# Altium footprint library Misc.PcbLib: 159 footprints (part 5 of 10)
Each footprint in its own frame and in the unit in brackets; x right, y up, seen from the top. Pads: shape width x height; smd on the part's side, far side on the other; paste and mask are expansions set on the pad; w line width, h text height; cw(c..) or ccw(c..) is an arc to the next point about the centre after c.
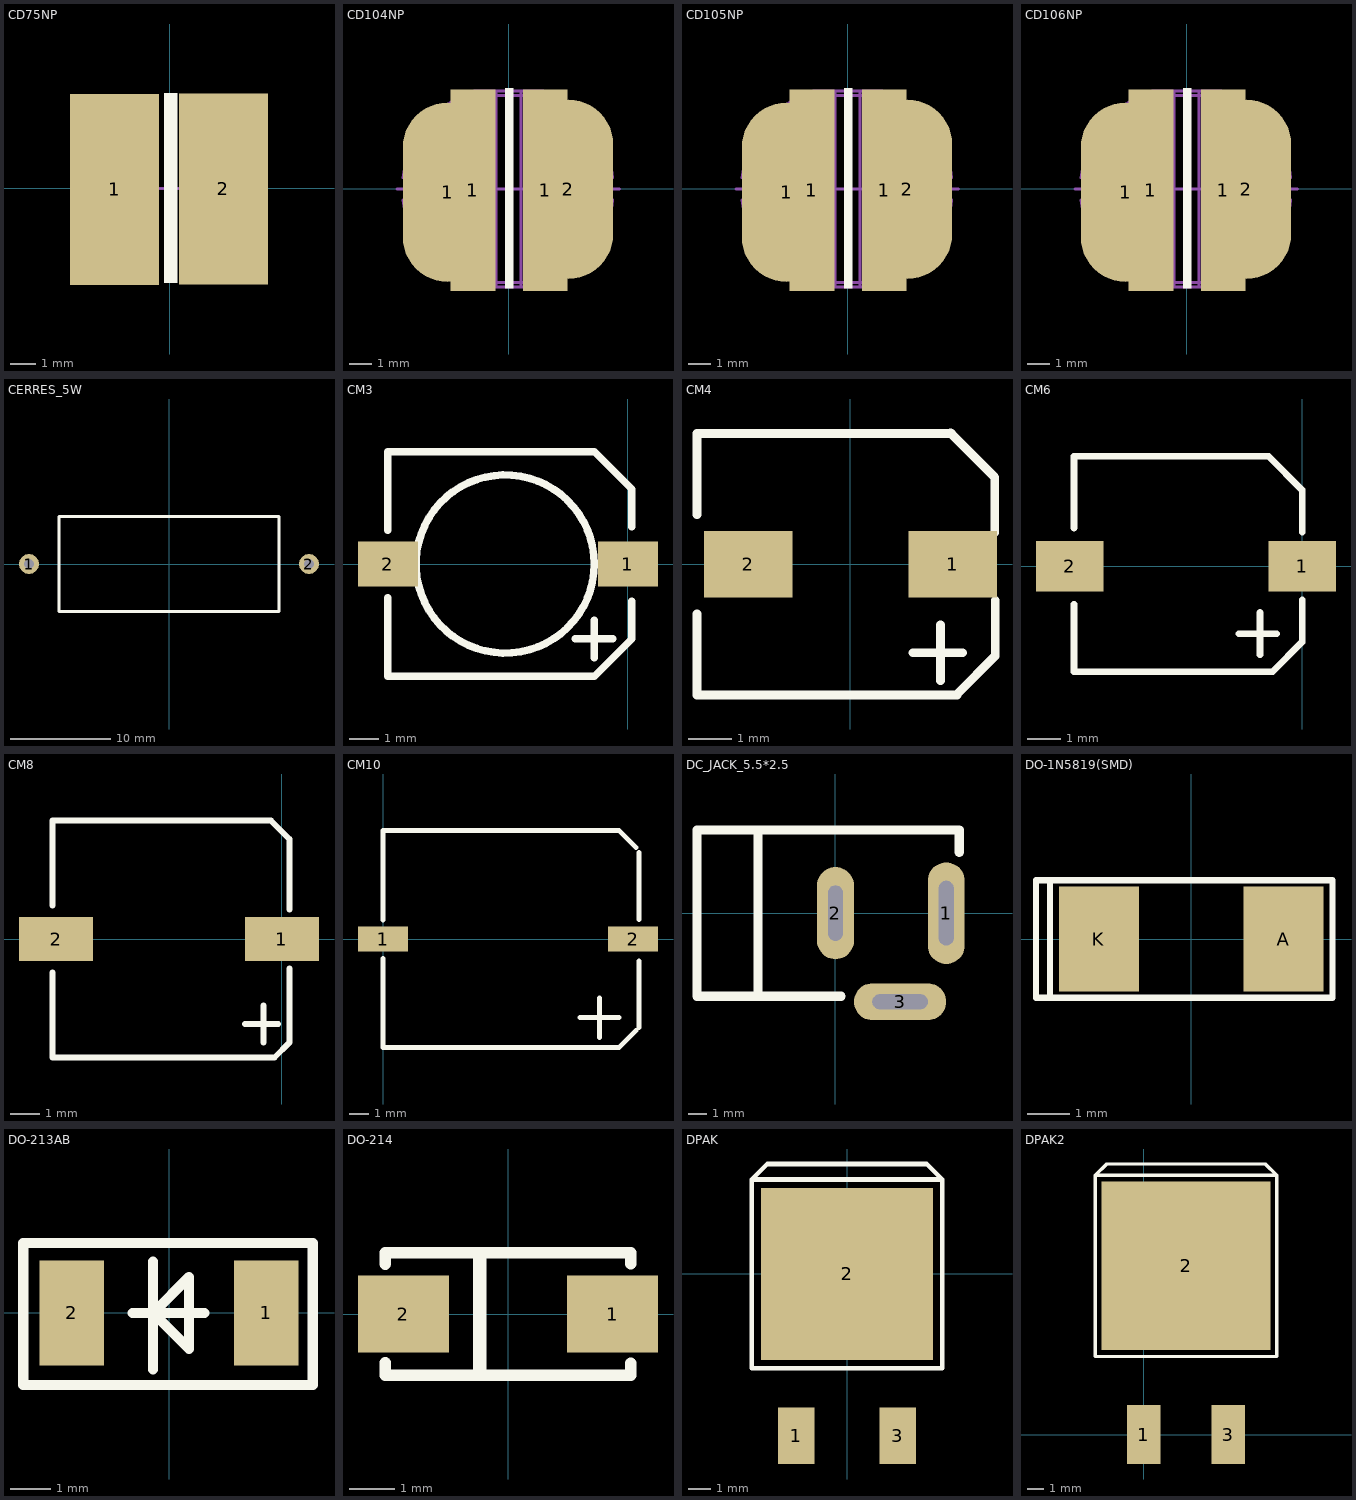
[diagram p4: the footprints below, top view; thin cyan lines are the x and y axes]

## CD75NP [mm]
pads (2):
  rect 3.5x7.5 smd: 1(-2.174,-0.051) 2(2.101,-0.028)
Top Overlay:
  rectangle: -0.232,-3.717 0.292,3.732
Mechanical 2:
  lines w0.127: -1.831,-0.017 1.584,-0.017 ; -0.016,-1.741 -0.016,1.427 ; -3.32,-0.82 ccw(c-0.016,-0.017) -1.616,-3.017 -0.766,-3.017 -0.766,2.983 -1.616,2.983 ccw(c-0.016,-0.017) -3.32,0.786 cw(c-3.916,-0.017) -3.32,-0.82 ; 0.734,-3.017 1.584,-3.017 ccw(c-0.016,-0.017) 3.288,-0.82 cw(c3.884,-0.017) 3.288,0.786 ccw(c-0.016,-0.017) 1.584,2.983 0.734,2.983 0.734,-3.017
3D body "CD75.STEP": height 5, standoff -0.05, extent -3.911,-3.567 3.825,3.433

## CD104NP [mm]
pads (4):
  oval 4x8 smd: 1(-2.741,-0.165) 2(2.652,-0.031)
  rect 2x9 smd: 1(-1.613,-0.082) 1(1.615,-0.082)
Top Overlay:
  rectangle: -0.189,-4.455 0.196,4.487
Mechanical 2:
  lines w0.127: -5.002,-0.017 4.931,-0.017 ; -0.016,-4.17 -0.016,4.264 ; -4.733,-0.515 ccw(c-0.017,0.102) -1.558,-4.398 1.523,-4.398 ccw(c-0.035,0.037) 4.633,-0.515 cw(c4.665,-0.016) 4.632,0.483 ccw(c-0.035,-0.079) 1.524,4.355 -1.558,4.355 ccw(c-0.018,-0.145) -4.732,0.483 cw(c-4.766,-0.016) -4.733,-0.515 ; -4.508,-0.667 ccw(c-4.766,-0.016) -4.507,0.634 cw(c-0.018,-0.145) -1.524,4.155 1.489,4.155 cw(c-0.035,-0.079) 4.408,0.635 ccw(c4.665,-0.016) 4.41,-0.668 cw(c-0.035,0.037) 1.489,-4.198 -1.524,-4.198 cw(c-0.017,0.102) -4.508,-0.667 ; -0.569,-4.398 0.538,-4.398 0.538,4.355 -0.569,4.355 -0.569,-4.398
3D body "CD104.STEP": height 4, standoff -0.05, extent -4.671,-4.396 4.695,4.356

## CD105NP [mm]
pads (4):
  oval 4x8 smd: 1(-2.741,-0.165) 2(2.652,-0.031)
  rect 2x9 smd: 1(-1.613,-0.082) 1(1.615,-0.082)
Top Overlay:
  rectangle: -0.189,-4.455 0.196,4.487
Mechanical 2:
  lines w0.127: -5.002,-0.017 4.931,-0.017 ; -0.016,-4.17 -0.016,4.264 ; -4.733,-0.515 ccw(c-4.766,-0.016) -4.732,0.483 cw(c-0.018,-0.145) -1.558,4.355 1.524,4.355 cw(c-0.035,-0.079) 4.632,0.483 ccw(c4.665,-0.016) 4.633,-0.515 cw(c-0.035,0.037) 1.523,-4.398 -1.558,-4.398 cw(c-0.017,0.102) -4.733,-0.515 ; -4.508,-0.667 ccw(c-0.017,0.102) -1.524,-4.198 1.489,-4.198 ccw(c-0.035,0.037) 4.41,-0.668 cw(c4.665,-0.016) 4.408,0.635 ccw(c-0.035,-0.079) 1.489,4.155 -1.524,4.155 ccw(c-0.018,-0.145) -4.507,0.634 cw(c-4.766,-0.016) -4.508,-0.667 ; -0.569,-4.398 -0.569,4.355 0.538,4.355 0.538,-4.398 -0.569,-4.398
3D body "CD105.STEP": height 5.4, standoff -0.05, extent -4.671,-4.396 4.695,4.356

## CD106NP [mm]
pads (4):
  oval 4x8 smd: 1(-2.741,-0.165) 2(2.652,-0.031)
  rect 2x9 smd: 1(-1.613,-0.082) 1(1.615,-0.082)
Top Overlay:
  rectangle: -0.189,-4.455 0.196,4.487
Mechanical 2:
  lines w0.127: -5.002,-0.017 4.931,-0.017 ; -0.016,-4.17 -0.016,4.264 ; -4.733,-0.515 ccw(c-0.017,0.102) -1.558,-4.398 1.523,-4.398 ccw(c-0.035,0.037) 4.633,-0.515 cw(c4.665,-0.016) 4.632,0.483 ccw(c-0.035,-0.079) 1.524,4.355 -1.558,4.355 ccw(c-0.018,-0.145) -4.732,0.483 cw(c-4.766,-0.016) -4.733,-0.515 ; -4.508,-0.667 ccw(c-4.766,-0.016) -4.507,0.634 cw(c-0.018,-0.145) -1.524,4.155 1.489,4.155 cw(c-0.035,-0.079) 4.408,0.635 ccw(c4.665,-0.016) 4.41,-0.668 cw(c-0.035,0.037) 1.489,-4.198 -1.524,-4.198 cw(c-0.017,0.102) -4.508,-0.667 ; -0.569,-4.398 0.538,-4.398 0.538,4.355 -0.569,4.355 -0.569,-4.398
3D body "CD106.STEP": height 6.5, standoff -0.05, extent -4.671,-4.396 4.695,4.356

## CERRES_5W [mm]
height 9.5
pads (2):
  round 2 hole 1: 1(-14,0) 2(14,0)
Top Overlay:
  lines w0.254: -11,-4.75 11,-4.75 11,4.75 -11,4.75 -11,-4.75
3D body "RES-5W-High.STEP": height 8.01, standoff -9, extent -14.27,-3 14.47,3

## CM3 [mil]
pads (2):
  rect 80x60 smd: 1(0,0) 2(-320,0)
Top Overlay:
  circle w10: c-163.85,0 r118.85
  lines w10: -320,-45 -320,-150 -45,-150 5,-100 5,-50 ; -320,45 -320,150 -45,150 5,100 5,50 ; -70,-100 -20,-100 ; -45,-125 -45,-75
3D body "SL-E.step": height 204.72, standoff 0, extent -302.8,-119.84 -27.2,140

## CM4 [mil]
pads (2):
  rect 80x60 smd: 1(92.52,0) 2(-92.52,0)
Top Overlay:
  lines w8: -138.7,-45 -138.7,-118.11 96.3,-118.11 ; -138.7,45 -138.7,118.11 91.3,118.11 ; 56.3,-80 101.3,-80 ; 81.3,-105 81.3,-55 ; 90.55,118.54 130.55,78.54 130.55,28.54 ; 95.94,-117.83 130.94,-82.83 130.94,-32.84
3D body "SL-B.step": height 204.72, standoff 0, extent -96.1,-74.29 85,95

## CM6 [mil]
pads (2):
  rect 80x60 smd: 1(0,0) 2(-275,0)
Top Overlay:
  lines w8: -270,-45 -270,-125 -35,-125 0,-90 0,-40 ; -270,45 -270,130 -40,130 0,90 0,40 ; -75,-80 -30,-80 ; -50,-105 -50,-55
3D body "SL-D.step": height 204.72, standoff 0, extent -255.24,-93.66 -34.76,115

## CM8 [mil]
pads (2):
  rect 100x60 smd: 1(0,0) 2(-305,0)
Top Overlay:
  lines w8: -310,-45 -310,-160 -10,-160 10,-140 10,-40 ; -310,45 -310,160 -15,160 10,135 10,40 ; -50,-115 -5,-115 ; -25,-140 -25,-90
3D body "SL-E.step": height 204.72, standoff 0, extent -292.8,-114.84 -17.2,145

## CM10 [mm]
pads (2):
  rect 2.54x1.27 smd: 1(0,0) 2(12.7,0)
Top Overlay:
  lines w0.254: 0,-1 0,-5.5 12,-5.5 12.847,-4.653 ; 0,0.96 0,5.5 12,5.5 12.847,4.653 ; 10,-4 12,-4 ; 11,-5 11,-3 ; 13,-4.5 13,-1.113 ; 13,1 13,4.387
3D body "SW3dPS-capacitor size G.STEP": height 10.21, standoff -0.01, extent 0.779,-5.055 12.379,5.245

## DC_JACK_5.5*2.5 [mm]
height 10
pads (3):
  oval 2x5.5 hole 0.8 slot 3.5 at 90 deg: 1(6,0)
  oval 2x5 hole 0.8 slot 3 at 90 deg: 2(0,0)
  oval 5x2 hole 0.8 slot 3 at 0 deg: 3(3.5,-4.8)
Top Overlay:
  lines w0.5: -4.2,-4.5 -4.2,4.5 ; 0.3,-4.5 -7.5,-4.5 -7.5,4.5 6.7,4.5 6.7,3.3
3D body "User Library-DC_JACK_10A.STEP": height 11, standoff -3.5, extent -7.35,-5.1 6.75,4.5

## DO-1N5819(SMD) [mm]
pads (2):
  rect 1.9x2.5 smd: A(2.2,0) K(-2.2,0)
Top Overlay:
  lines w0.15: -3.365,-1.397 -3.365,1.397 ; -3.7,-1.397 3.365,-1.397 3.365,1.397 -3.7,1.397 -3.7,-1.397
3D body "User Library-DO-214AC SMA.step": height 2.4, standoff 0, extent -2.6,-1.3 2.6,1.3

## DO-213AB [mm] "LL4150X25MM"
pads (2):
  rect 1.6x2.6 smd: 1(2.4,0) 2(-2.4,0)
Top Overlay:
  lines w0.254: -0.902,0 0.876,0 ; -0.394,-1.397 -0.394,1.27 ; -3.594,-1.778 3.543,-1.778 3.543,1.727 -3.594,1.727 -3.594,-1.778 ; -0.394,0 0.495,-0.889 0.495,0.889 -0.394,0
3D body "DO-213AB.step": height 1.34, standoff -1.34, extent -2.562,-1.346 2.638,1.324

## DO-214 [mm]
height 2.7
pads (2):
  rect 2x1.7 smd: 1(2.3,0) 2(-2.3,0)
Top Overlay:
  lines w0.254: -2.7,-1.35 -2.7,-1.075 ; -2.7,1.1 -2.7,1.35 2.7,1.35 2.7,1.105 ; -2.695,-1.35 2.7,-1.35 2.7,-1.08
  lines w0.3: -0.62,-1.3 -0.62,1.3
3D body "User Library-S1G.STEP": height 2.12, standoff -0.02, extent -2.608,-1.325 2.498,1.342

## DPAK [mm]
pads (3):
  rect 1.6x2.5 smd: 1(-2.25,-7.18) 3(2.25,-7.18)
  rect 7.62x7.62 smd: 2(0,0)
Top Overlay:
  lines w0.203: -4.216,4.191 -3.531,4.877 3.531,4.877 4.216,4.191 ; -4.216,4.191 4.216,4.191 ; -4.216,4.191 -4.216,-4.191 4.216,-4.191 4.216,4.191

## DPAK2 [mil]
pads (3):
  rect 80x140 smd: 1(0,0) 3(200,0)
  rect 400x400 smd: 2(100,400)
Top Overlay:
  lines w8: -115,615 -88,642 288,642 315,615 ; -115,615 315,615 ; -115,615 -115,185 315,185 315,615
3D body "SW3dPS-DPAK.STEP": height 192.32, standoff -5.24, extent -100,-40.46 300,560.47